# Altium footprint library bethu.PcbLib: 628 footprints (part 32 of 40)
Each footprint in its own frame and in the unit in brackets; x right, y up, seen from the top. Pads: shape width x height; smd on the part's side, far side on the other; paste and mask are expansions set on the pad; w line width, h text height; cw(c..) or ccw(c..) is an arc to the next point about the centre after c.
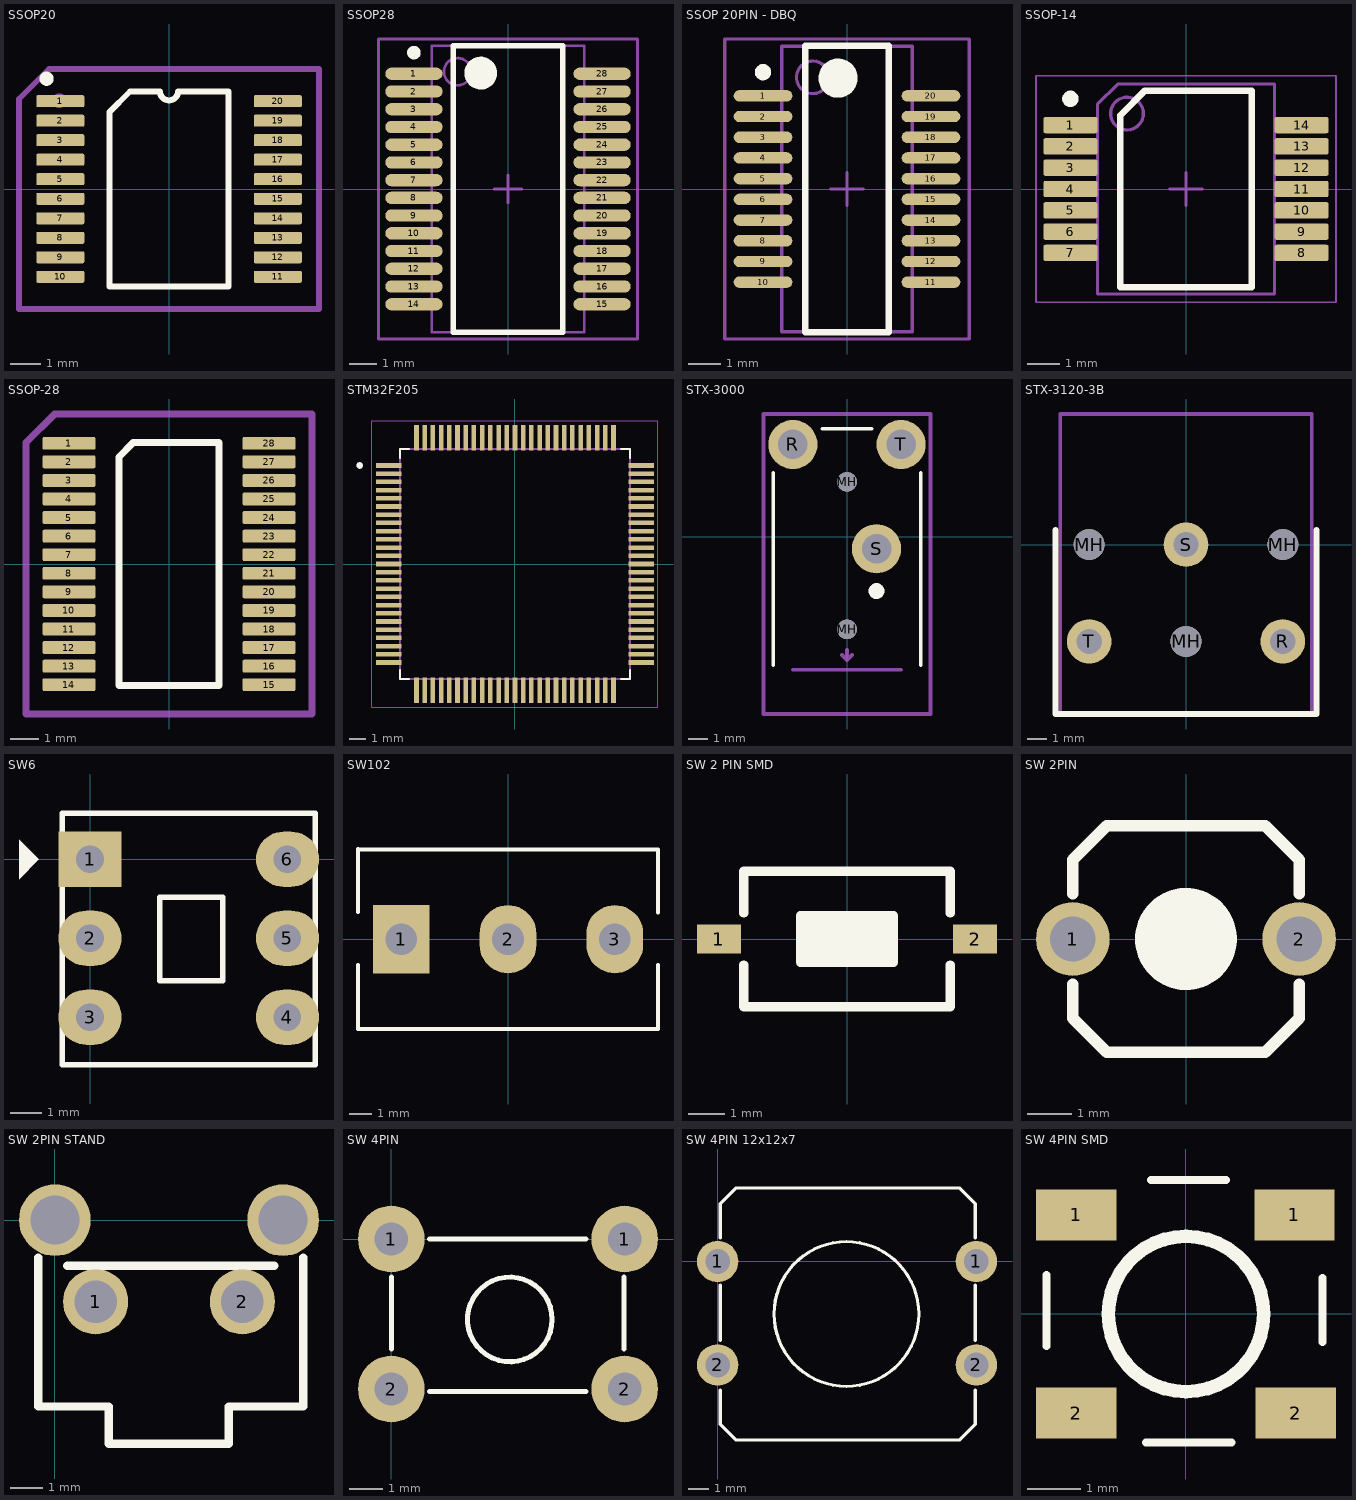
[diagram p31: the footprints below, top view; thin cyan lines are the x and y axes]

## SSOP20 [mm]
pads (20):
  rrect25% 1.6x0.4 smd mask+0.07: 1(-3.625,2.925) 2(-3.625,2.275) 3(-3.625,1.625) 4(-3.625,0.975) 5(-3.625,0.325) 6(-3.625,-0.325) 7(-3.625,-0.975) 8(-3.625,-1.625) 9(-3.625,-2.275) 10(-3.625,-2.925) 11(3.625,-2.925) 12(3.625,-2.275) 13(3.625,-1.625) 14(3.625,-0.975) 15(3.625,-0.325) 16(3.625,0.325) 17(3.625,0.975) 18(3.625,1.625) 19(3.625,2.275) 20(3.625,2.925)
Top Overlay:
  circle w0.25: c-4.079,3.677 r0.112
  lines w0.2: -1.99,-3.25 -1.99,2.56 -1.3,3.25 -0.3,3.25 ccw(c0,3.25) 0.3,3.25 1.99,3.25 1.99,-3.25 -1.99,-3.25
Mechanical 13:
  circle w0.25: c-3.66,2.943 r0.117
  lines w0.2: -5,-4 5,-4 5,4 -4,4 -5,3 -5,-4
  text "'.Designator'" at -5.84,-0.925 h1
3D body "SSOP20.step": height 1.85, standoff 0.01, extent -3.95,-3.63 3.95,3.67

## SSOP28 [mm]
height 2
pads (28):
  oval 2.1x0.45 smd: 1(-3.45,4.225) 2(-3.45,3.575) 3(-3.45,2.925) 4(-3.45,2.275) 5(-3.45,1.625) 6(-3.45,0.975) 7(-3.45,0.325) 8(-3.45,-0.325) 9(-3.45,-0.975) 10(-3.45,-1.625) 11(-3.45,-2.275) 12(-3.45,-2.925) 13(-3.45,-3.575) 14(-3.45,-4.225) 15(3.45,-4.225) 16(3.45,-3.575) 17(3.45,-2.925) 18(3.45,-2.275) 19(3.45,-1.625) 20(3.45,-0.975) 21(3.45,-0.325) 22(3.45,0.325) 23(3.45,0.975) 24(3.45,1.625) 25(3.45,2.275) 26(3.45,2.925) 27(3.45,3.575) 28(3.45,4.225)
Top Overlay:
  circle w0.6: c-1,4.25 r0.3
  circle w0.25: c-3.45,5 r0.125
  lines w0.2: -2,-5.25 2,-5.25 2,5.25 -2,5.25 -2,-5.25
Mechanical 13:
  circle w0.1: c-1.85,4.3 r0.5
  lines w0.1: -2.8,-5.25 2.8,-5.25 2.8,5.25 -2.8,5.25 -2.8,-5.25
Mechanical 15:
  lines w0.1: -0.5,0 0.5,0 ; 0,-0.5 0,0.5 ; -4.75,-5.5 4.75,-5.5 4.75,5.5 -4.75,5.5 -4.75,-5.5
3D body "User Library-SSOP-28-1.STEP": height 2.15, standoff 0, extent -3.878,-5.165 3.878,5.165

## SSOP 20PIN - DBQ [mm]
height 1.75
pads (20):
  oval 1.8x0.35 smd: 1(-2.575,2.857) 2(-2.575,2.222) 3(-2.575,1.587) 4(-2.575,0.953) 5(-2.575,0.318) 6(-2.575,-0.318) 7(-2.575,-0.953) 8(-2.575,-1.587) 9(-2.575,-2.222) 10(-2.575,-2.857) 11(2.575,-2.857) 12(2.575,-2.222) 13(2.575,-1.587) 14(2.575,-0.953) 15(2.575,-0.318) 16(2.575,0.318) 17(2.575,0.953) 18(2.575,1.587) 19(2.575,2.222) 20(2.575,2.857)
Top Overlay:
  circle w0.25: c-2.575,3.582 r0.125
  circle w0.6: c-0.275,3.4 r0.3
  lines w0.2: -1.275,-4.4 -1.275,4.4 1.275,4.4 1.275,-4.4 -1.275,-4.4
Mechanical 13:
  circle w0.1: c-1.05,3.425 r0.5
  lines w0.1: -2,-4.375 -2,4.375 2,4.375 2,-4.375 -2,-4.375
Mechanical 15:
  lines w0.1: -0.5,0 0.5,0 ; 0,-0.5 0,0.5 ; -3.75,-4.6 -3.75,4.6 3.75,4.6 3.75,-4.6 -3.75,-4.6
3D body "CY74FCT2244T1.STEP": height 1.85, standoff 0, extent -3.1,-4.375 3.1,4.375

## SSOP-14 [mm]
height 2
pads (14):
  rrect25% 1.65x0.5 smd mask+0.15: 1(-3.525,1.95) 2(-3.525,1.3) 3(-3.525,0.65) 4(-3.525,0) 5(-3.525,-0.65) 6(-3.525,-1.3) 7(-3.525,-1.95) 8(3.525,-1.95) 9(3.525,-1.3) 10(3.525,-0.65) 11(3.525,0) 12(3.525,0.65) 13(3.525,1.3) 14(3.525,1.95)
Top Overlay:
  circle w0.25: c-3.525,2.75 r0.125
  lines w0.2: -2,-3 2,-3 2,3 -1.25,3 -2,2.25 -2,-3
Mechanical 13:
  circle w0.1: c-1.8,2.3 r0.5
  lines w0.1: -2.7,-3.2 2.7,-3.2 2.7,3.2 -2.079,3.2 -2.7,2.579 -2.7,-3.2
  text "'.Designator'" at -6.315,-1.4 h1
Mechanical 15:
  lines w0.05: -4.575,-3.45 -4.575,3.45 4.575,3.45 4.575,-3.45 -4.575,-3.45
  lines w0.1: -0.5,0 0.5,0 ; 0,-0.5 0,0.5
3D body "SSOP-14.step": height 2, standoff 0, extent -3.875,-3.2 3.875,3.2

## SSOP-28 [mm]
pads (28):
  rrect25% 1.85x0.45 smd mask+0.15: 1(-3.5,4.225) 2(-3.5,3.575) 3(-3.5,2.925) 4(-3.5,2.275) 5(-3.5,1.625) 6(-3.5,0.975) 7(-3.5,0.325) 8(-3.5,-0.325) 9(-3.5,-0.975) 10(-3.5,-1.625) 11(-3.5,-2.275) 12(-3.5,-2.925) 13(-3.5,-3.575) 14(-3.5,-4.225) 15(3.5,-4.225) 16(3.5,-3.575) 17(3.5,-2.925) 18(3.5,-2.275) 19(3.5,-1.625) 20(3.5,-0.975) 21(3.5,-0.325) 22(3.5,0.325) 23(3.5,0.975) 24(3.5,1.625) 25(3.5,2.275) 26(3.5,2.925) 27(3.5,3.575) 28(3.5,4.225)
Top Overlay:
  lines w0.25: -1.75,-4.25 1.75,-4.25 1.75,4.25 -1.25,4.25 -1.75,3.75 -1.75,-4.25
Mechanical 13:
  lines w0.25: -5,-5.25 5,-5.25 5,5.25 -4,5.25 -5,4.25 -5,-5.25
  text "'.Designator'" at -5.815,-0.9 h1
3D body "SSOP-28.STEP": height 2.01, standoff 0.01, extent -3.909,-5.108 3.891,5.092

## STM32F205 [mm]
height 1.6
pads (100):
  rect 1.56x0.28 smd: 1(-7.68,6) 2(-7.68,5.5) 3(-7.68,5) 4(-7.68,4.5) 5(-7.68,4) 6(-7.68,3.5) 7(-7.68,3) 8(-7.68,2.5) 9(-7.68,2) 10(-7.68,1.5) 11(-7.68,1) 12(-7.68,0.5) 13(-7.68,0) 14(-7.68,-0.5) 15(-7.68,-1) 16(-7.68,-1.5) 17(-7.68,-2) 18(-7.68,-2.5) 19(-7.68,-3) 20(-7.68,-3.5) 21(-7.68,-4) 22(-7.68,-4.5) 23(-7.68,-5) 24(-7.68,-5.5) 25(-7.68,-6) 51(7.68,-6) 52(7.68,-5.5) 53(7.68,-5) 54(7.68,-4.5) 55(7.68,-4) 56(7.68,-3.5) 57(7.68,-3) 58(7.68,-2.5) 59(7.68,-2) 60(7.68,-1.5) 61(7.68,-1) 62(7.68,-0.5) 63(7.68,0) 64(7.68,0.5) 65(7.68,1) 66(7.68,1.5) 67(7.68,2) 68(7.68,2.5) 69(7.68,3) 70(7.68,3.5) 71(7.68,4) 72(7.68,4.5) 73(7.68,5) 74(7.68,5.5) 75(7.68,6)
  rect 0.28x1.56 smd: 26(-6,-7.68) 27(-5.5,-7.68) 28(-5,-7.68) 29(-4.5,-7.68) 30(-4,-7.68) 31(-3.5,-7.68) 32(-3,-7.68) 33(-2.5,-7.68) 34(-2,-7.68) 35(-1.5,-7.68) 36(-1,-7.68) 37(-0.5,-7.68) 38(0,-7.68) 39(0.5,-7.68) 40(1,-7.68) 41(1.5,-7.68) 42(2,-7.68) 43(2.5,-7.68) 44(3,-7.68) 45(3.5,-7.68) 46(4,-7.68) 47(4.5,-7.68) 48(5,-7.68) 49(5.5,-7.68) 50(6,-7.68) 76(6,7.68) 77(5.5,7.68) 78(5,7.68) 79(4.5,7.68) 80(4,7.68) 81(3.5,7.68) 82(3,7.68) 83(2.5,7.68) 84(2,7.68) 85(1.5,7.68) 86(1,7.68) 87(0.5,7.68) 88(0,7.68) 89(-0.5,7.68) 90(-1,7.68) 91(-1.5,7.68) 92(-2,7.68) 93(-2.5,7.68) 94(-3,7.68) 95(-3.5,7.68) 96(-4,7.68) 97(-4.5,7.68) 98(-5,7.68) 99(-5.5,7.68) 100(-6,7.68)
Top Overlay:
  circle w0.2: c-9.46,6 r0.1
  lines w0.127: -7,-6.46 -7,-7 -6.46,-7 ; -7,6.46 -7,7 -6.46,7 ; 6.46,-7 7,-7 7,-6.46 ; 6.46,7 7,7 7,6.46
Mechanical 13:
  circle w0.2: c-9.46,6 r0.1
  lines w0.127: -7,-7 7,-7 7,7 -7,7 -7,-7
Mechanical 15:
  lines w0.05: -8.71,-8.71 -8.71,8.71 8.71,8.71 8.71,-8.71 -8.71,-8.71
3D body "step_temp.STEP": height 1.6, standoff 0, extent -8,-8 8,8

## STX-3000 [mm]
height 5.4
pads (5):
  round 1 hole 1 unplated: MH(0,-4.7) MH(0,2.8)
  round 2.5 hole 1.5: R(-2.75,4.7) S(1.5,-0.6) T(2.75,4.7)
Top Overlay:
  circle w0.5: c1.5,-2.75 r0.15
  lines w0.2: -3.75,-6.5 -3.75,3.25 ; -1.25,5.5 1.25,5.5 ; 3.75,-6.5 3.75,3.25
Mechanical 13:
  circle w0.5: c1.5,-2.75 r0.15
  lines w0.2: -2.75,-6.75 2.75,-6.75 ; -0.25,-6 0,-6.25 ; 0,-5.75 0,-6.25 ; 0.25,-6 0,-6.25 ; -4.25,-9 -4.25,-5 -4.25,6.25 4.25,6.25 4.25,-7.25 4.25,-9 -4.25,-9
  text "'.Designator'" at -5.665,-0.417 h1
3D body "STX-3000.stp": height 5.93, standoff -2.72, extent -3.6,-8.7 3.6,5.266

## STX-3120-3B [mm]
pads (6):
  round 1.6 hole 1.6 unplated: MH(-5,0) MH(0,-5) MH(5,0)
  round 2.3 hole 1.3: R(5,-5) S(0,0) T(-5,-5)
Top Overlay:
  lines w0.3: -6.75,0.75 -6.75,-8.75 6.75,-8.75 6.75,0.75
Mechanical 13:
  lines w0.2: -6.5,-8.75 6.5,-8.75 6.5,6.75 -6.5,6.75 -6.5,-8.75
  text ".Designator" at -4.998,-0.333 h1
3D body "STX-3120-3B.STEP": height 10.22, standoff -3.68, extent -6,-8.6 6,6.5

## SW6 [mil] "SW DTDP - 6Pin 260x300x300 mil"
pads (6):
  rect 80x70 hole 35: 1(0,0)
  oval 80x70 hole 35: 2(0,-100) 3(0,-200) 4(250,-200) 5(250,-100) 6(250,0)
Top Overlay:
  region: -90,25 -65,0 -90,-25
  lines w7: -35,-260 285,-260 285,58 -35,58 -35,-260 ; 88,-154 168,-154 168,-48 88,-48 88,-154
3D body "User Library-PSM1-0-0.STEP": height 532.1, standoff -137.19, extent -33.48,-259.48 281.48,55.49

## SW102 [mm] "Switch 102 On Board nho"
height 0.051
pads (3):
  rect 2.5x3 hole 1.4: 1(-4.7,0)
  oval 2.5x3 hole 1.4: 2(0,0) 3(4.7,0)
Top Overlay:
  lines w0.178: -6.6,-1.143 -6.6,-3.95 6.6,-3.95 6.6,-1.143 ; -6.6,1.194 -6.6,3.967 ; -6.6,3.95 6.6,3.95 6.6,1.168
3D body "SW3dPS-SWITCH SPDT_O_N_O.STEP": height 27.87, standoff -3.17, extent -6.35,-5.93 6.35,5.93

## SW 2 PIN SMD [mm] "Switch SMD type"
pads (2):
  rect 1.2x0.8 smd: 1(-3.5,0) 2(3.5,0)
Top Overlay:
  rectangle: -1.27,-0.635 1.27,0.635
  lines w0.254: -2.819,-0.711 -2.819,-1.854 2.819,-1.854 2.819,-0.711 ; -2.819,0.711 -2.819,1.854 2.819,1.854 2.819,0.711 ; -1.27,-0.635 -1.27,0.635 1.27,0.635 1.27,-0.635 -1.27,-0.635
3D body "User Library-Button-SMD.step": height 2.5, standoff 0, extent -3.05,-1.85 3.05,1.85

## SW 2PIN [mil] "Button 200mil 2 Pin"
pads (2):
  round 65 hole 40: 1(-100,0) 2(100,0)
Top Overlay:
  circle w50: c0,0 r20
  lines w10: -100,-40 -100,-70 -70,-100 70,-100 100,-70 100,-40 ; -100,40 -100,70 -70,100 70,100 100,70 100,40

## SW 2PIN STAND [mm]
pads (4):
  round 2 hole 1.3: 1(1.25,-2.5) 2(5.75,-2.5)
  round 2.2 hole 1.5: ""(0,0) ""(7,0)
Top Overlay:
  lines w0.254: -0.508,-1.143 -0.508,-5.715 1.651,-5.715 1.651,-6.858 5.334,-6.858 5.334,-5.715 6.477,-5.715 7.62,-5.715 7.62,-1.143 ; 0.381,-1.397 6.731,-1.397
3D body "Part1.STEP": height 7.1, standoff -3.5, extent -0.918,-6.858 8.031,0.992

## SW 4PIN [mm] "SW button 4pin, 250 x250 mil"
height 2.54
pads (4):
  round 2 hole 1: 1(0,0) 1(7,0) 2(0,-4.5) 2(7,-4.5)
Top Overlay:
  circle w0.152: c3.556,-2.413 r1.27
  lines w0.152: 0,-3.302 0,-1.143 ; 1.143,-4.572 5.842,-4.572 ; 1.143,0 5.842,0 ; 6.985,-3.302 6.985,-1.143
3D body "SW3dPS-.STEP": height 7, standoff -3.5, extent -0.521,-5.386 7.379,0.814

## SW 4PIN 12x12x7 [mm]
pads (4):
  round 2 hole 1.2: 1(0,0) 1(12.5,0) 2(0,-5) 2(12.5,-5)
Top Overlay:
  circle w0.152: c6.223,-2.54 r3.5
  lines w0.152: 0.127,-6.223 0.127,-7.874 0.889,-8.636 11.684,-8.636 12.446,-7.874 12.446,-6.223 ; 0.127,-3.81 0.127,-1.143 ; 0.127,1.143 0.127,2.794 0.889,3.556 11.684,3.556 12.446,2.794 12.446,1.143 ; 12.446,-3.81 12.446,-1.143
3D body "User Library-tact switch 12x12x8mm.STEP": height 8.5, standoff -3.5, extent -0.662,-8.54 13.208,3.46

## SW 4PIN SMD [mm]
pads (4):
  rect 1.5x0.95 smd: 1(-2.05,1.85) 1(2.025,1.85) 2(-2.05,-1.85) 2(2.05,-1.85)
Top Overlay:
  circle w0.254: c0,0 r1.45
  lines w0.15: -2.6,-0.6 -2.6,0.725 ; -0.75,-2.4 0.85,-2.4 ; -0.65,2.5 0.75,2.5 ; 2.55,-0.525 2.55,0.675
3D body "buttom_smd.STEP": height 1.75, standoff 0.25, extent -3.275,-2.6 3.125,2.65